# Altium footprint library ICs And Semiconductors SMD.PcbLib: 943 footprints (part 18 of 60)
Each footprint in its own frame and in the unit in brackets; x right, y up, seen from the top. Pads: shape width x height; smd on the part's side, far side on the other; paste and mask are expansions set on the pad; w line width, h text height; cw(c..) or ccw(c..) is an arc to the next point about the centre after c.
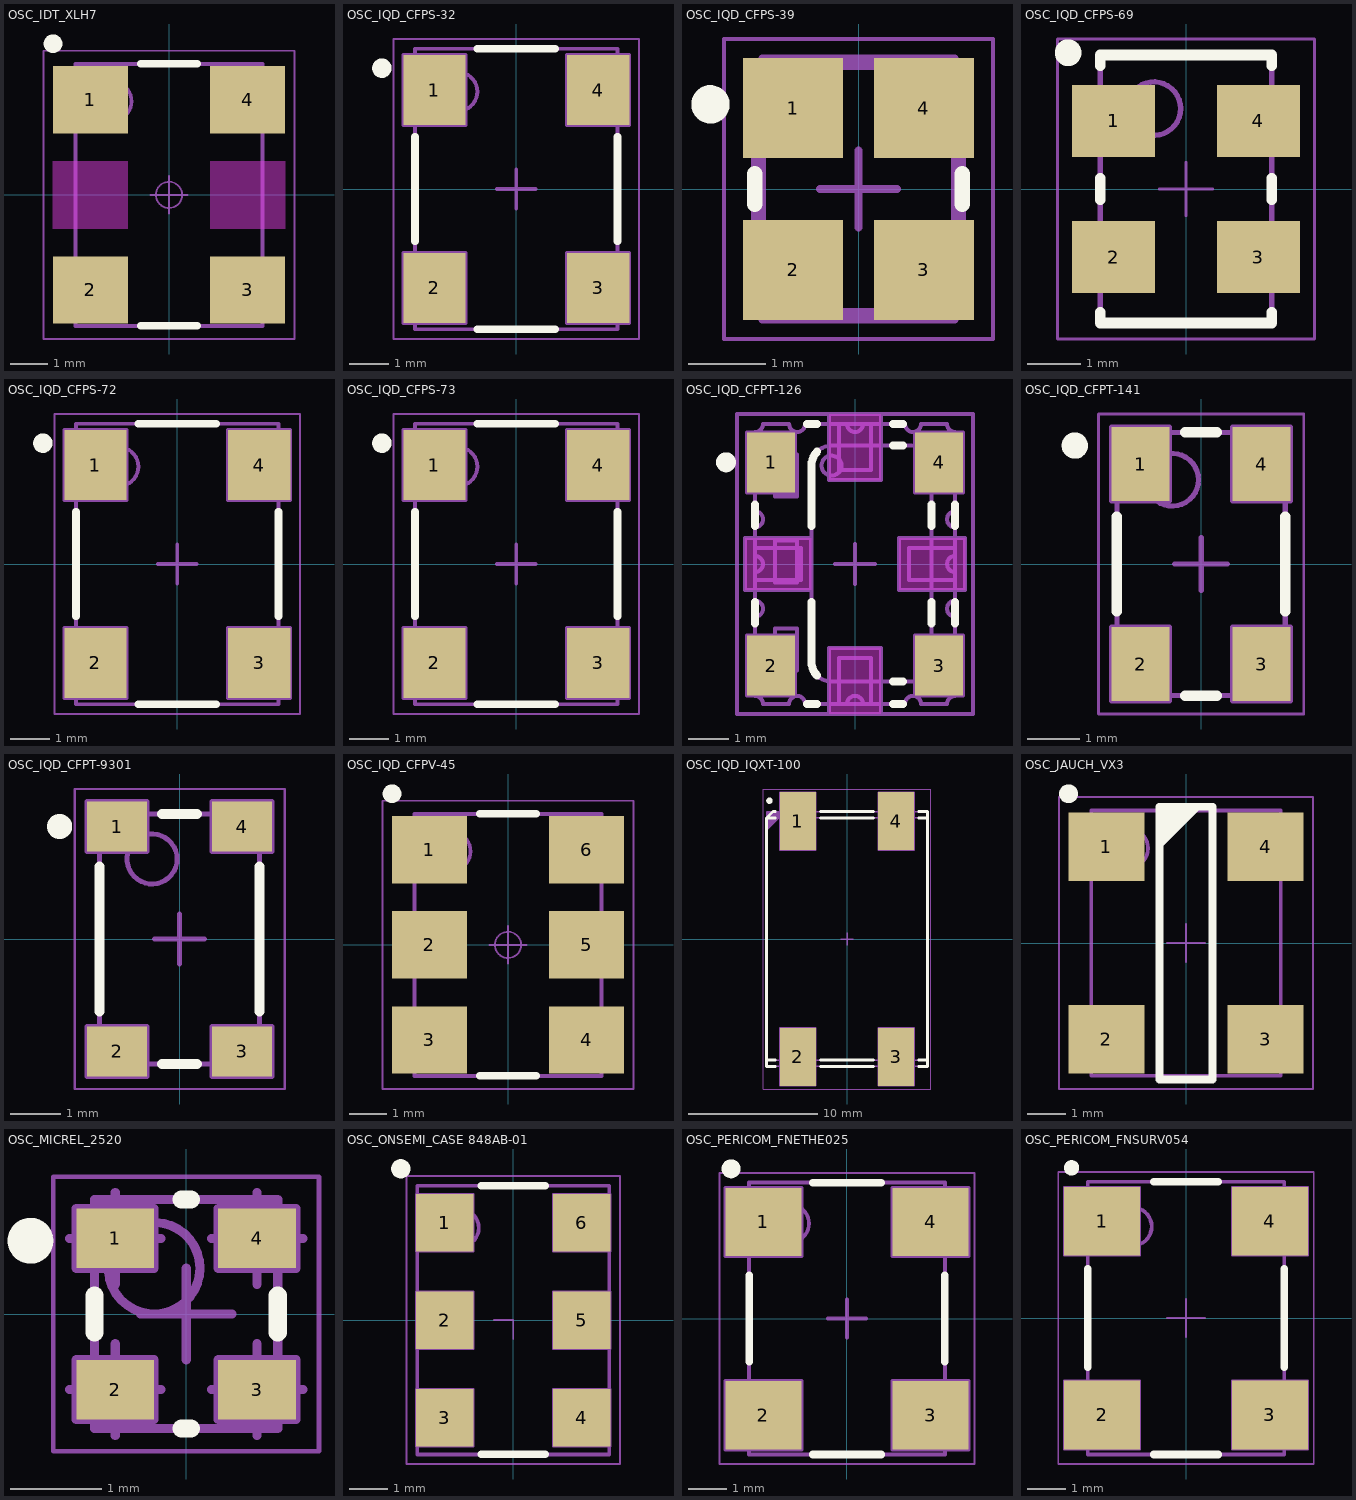
[diagram p17: the footprints below, top view; thin cyan lines are the x and y axes]

## OSC_IDT_XLH7 [mm] "SMD Oscillator, Side Convave, 6 Pins, 5.00x7.00mm IDT XLH Series"
height 1.45
pads (4):
  rect 2x1.8 smd: 1(-2.1,2.54) 2(-2.1,-2.54) 3(2.1,-2.54) 4(2.1,2.54)
Top Layer keep-out:
  region: -3.1,0.9 -1.1,0.9 -1.1,-0.9 -3.1,-0.9
  region: 1.1,0.9 3.1,0.9 3.1,-0.9 1.1,-0.9
Top Overlay:
  circle w0.25: c-3.1,4.04 r0.125
  lines w0.2: -0.75,-3.5 0.75,-3.5 ; -0.75,3.5 0.75,3.5
Mechanical 14:
  circle w0.1: c-1.5,2.5 r0.5
  lines w0.1: -2.5,-3.5 2.5,-3.5 2.5,3.5 -2.5,3.5 -2.5,-3.5
Mechanical 15:
  circle w0.05: c0,0 r0.35
  lines w0.05: -0.5,0 0.5,0 ; 0,-0.5 0,0.5 ; -3.35,-3.85 3.35,-3.85 3.35,3.85 -3.35,3.85 -3.35,-3.85
3D body "OSC_IDT_XLH7.stp": height 1.45, standoff 0, extent -2.6,-3.6 2.6,3.6

## OSC_IQD_CFPS-32 [mm] "Oscillator, Side Concave; 5.08mm Pitch; 4 Pins, 5.00mm L X 7.00mm W X 1.40mm H, CFPS-32 Series"
height 1.4
pads (4):
  rect 1.6x1.8 smd: 1(-2.1,2.54) 2(-2.1,-2.54) 3(2.1,-2.54) 4(2.1,2.54)
Top Overlay:
  circle w0.25: c-3.45,3.1 r0.125
  lines w0.2: -2.6,-1.34 -2.6,1.34 ; -1,-3.6 1,-3.6 ; -1,3.6 1,3.6 ; 2.6,-1.34 2.6,1.34
Mechanical 8:
  lines w0.1: -2.6,-2.54 -2.1,-2.54 ; -2.6,2.54 -2.1,2.54 ; -2.1,-3.04 -2.1,-2.54 ; -2.1,-2.04 -2.1,-2.54 ; -2.1,2.04 -2.1,2.54 ; -2.1,3.04 -2.1,2.54 ; -1.6,-2.54 -2.1,-2.54 ; -1.6,2.54 -2.1,2.54 ; -0.5,0 0,0 ; 0,-0.5 0,0 ; 0,0.5 0,0 ; 0.5,0 0,0 ; 1.6,-2.54 2.1,-2.54 ; 1.6,2.54 2.1,2.54 ; 2.1,-3.04 2.1,-2.54 ; 2.1,-2.04 2.1,-2.54 ; 2.1,2.04 2.1,2.54 ; 2.1,3.04 2.1,2.54 ; 2.6,-2.54 2.1,-2.54 ; 2.6,2.54 2.1,2.54 ; -2.9,-3.44 -1.3,-3.44 -1.3,-1.64 -2.9,-1.64 -2.9,-3.44 ; -2.9,1.64 -1.3,1.64 -1.3,3.44 -2.9,3.44 -2.9,1.64 ; 1.3,-3.44 2.9,-3.44 2.9,-1.64 1.3,-1.64 1.3,-3.44 ; 1.3,1.64 2.9,1.64 2.9,3.44 1.3,3.44 1.3,1.64
Mechanical 14:
  circle w0.1: c-1.5,2.5 r0.5
  lines w0.1: -2.6,-3.6 2.6,-3.6 2.6,3.6 -2.6,3.6 -2.6,-3.6
Mechanical 15:
  lines w0.05: -3.15,-3.85 -3.15,3.85 3.15,3.85 3.15,-3.85 -3.15,-3.85
3D body "OSC_IQD_CFPS-32.stp": height 1.4, standoff 0, extent -2.6,-3.6 2.6,3.6

## OSC_IQD_CFPS-39 [mm] "Oscillator, Side Concave, 2.20mm Pitch, 4 Pins, 2.70mm L X 3.40mm W X 1.20mm H, CFPS-39 Series"
height 1.2
pads (4):
  rect 1.3x1.3 smd: 1(-0.85,1.05) 2(-0.85,-1.05) 3(0.85,-1.05) 4(0.85,1.05)
Top Overlay:
  circle w0.25: c-1.925,1.1 r0.125
  lines w0.2: -1.35,-0.2 -1.35,0.2 ; 1.35,-0.2 1.35,0.2
Mechanical 8:
  lines w0.1: -1.35,-1.05 -0.85,-1.05 ; -1.35,1.05 -0.85,1.05 ; -0.85,-1.55 -0.85,-1.05 ; -0.85,-0.55 -0.85,-1.05 ; -0.85,0.55 -0.85,1.05 ; -0.85,1.55 -0.85,1.05 ; -0.5,0 0,0 ; -0.35,-1.05 -0.85,-1.05 ; -0.35,1.05 -0.85,1.05 ; 0,-0.5 0,0 ; 0,0.5 0,0 ; 0.35,-1.05 0.85,-1.05 ; 0.35,1.05 0.85,1.05 ; 0.5,0 0,0 ; 0.85,-1.55 0.85,-1.05 ; 0.85,-0.55 0.85,-1.05 ; 0.85,0.55 0.85,1.05 ; 0.85,1.55 0.85,1.05 ; 1.35,-1.05 0.85,-1.05 ; 1.35,1.05 0.85,1.05
Mechanical 14:
  circle w0.1: c-0.65,1.05 r0.3
  lines w0.1: -1.35,-1.6 cw(c-1.35,-1.7) -1.25,-1.7 1.25,-1.7 cw(c1.35,-1.7) 1.35,-1.6 1.35,1.6 cw(c1.35,1.7) 1.25,1.7 -1.25,1.7 cw(c-1.35,1.7) -1.35,1.6 -1.35,-1.6 ; -1.25,-1.4 ccw(c-1.05,-1.4) -1.05,-1.6 1.05,-1.6 ccw(c1.05,-1.4) 1.25,-1.4 1.25,1.4 ccw(c1.05,1.4) 1.05,1.6 -1.05,1.6 ccw(c-1.05,1.4) -1.25,1.4 -1.25,-1.4
Mechanical 15:
  lines w0.05: -1.75,-1.95 -1.75,1.95 1.75,1.95 1.75,-1.95 -1.75,-1.95
3D body "OSC_IQD_CFPS-39.stp": height 1.3, standoff 0, extent -1.35,-1.7 1.35,1.7

## OSC_IQD_CFPS-69 [mm] "Oscillator, Side Concave, 2.54mm Pitch, 4 Pins, 3.20mm L X 5.00mm W X 1.00mm H, CFPS-69 Series"
height 0.95
pads (4):
  rect 1.55x1.35 smd: 1(-1.35,1.27) 2(-1.35,-1.27) 3(1.35,-1.27) 4(1.35,1.27)
Top Overlay:
  circle w0.25: c-2.2,2.545 r0.125
  lines w0.2: -1.6,-2.3 -1.6,-2.5 1.6,-2.5 1.6,-2.3 ; -1.6,-0.2 -1.6,0.2 ; -1.6,2.3 -1.6,2.5 1.6,2.5 1.6,2.3 ; 1.6,-0.2 1.6,0.2
Mechanical 14:
  circle w0.1: c-0.6,1.5 r0.5
  lines w0.1: -1.6,-2.5 1.6,-2.5 1.6,2.5 -1.6,2.5 -1.6,-2.5
Mechanical 15:
  lines w0.05: -0.5,0 0.5,0 ; 0,-0.5 0,0.5 ; -2.4,-2.8 2.4,-2.8 2.4,2.8 -2.4,2.8 -2.4,-2.8
3D body "OSC_IQD_CFPS-69.stp": height 0.95, standoff 0, extent -1.7,-2.6 1.7,2.6

## OSC_IQD_CFPS-72 [mm] "Oscillator, Side Concave, 5.08mm Pitch, 4 Pins, 5.00mm L X 7.00mm W X 1.40mm H, CFPS-72 Series"
height 1.4
pads (4):
  rect 1.6x1.8 smd: 1(-2.1,2.54) 2(-2.1,-2.54) 3(2.1,-2.54) 4(2.1,2.54)
Top Overlay:
  circle w0.25: c-3.45,3.1 r0.125
  lines w0.2: -2.6,-1.34 -2.6,1.34 ; -1,-3.6 1,-3.6 ; -1,3.6 1,3.6 ; 2.6,-1.34 2.6,1.34
Mechanical 8:
  lines w0.1: -2.6,-2.54 -2.1,-2.54 ; -2.6,2.54 -2.1,2.54 ; -2.1,-3.04 -2.1,-2.54 ; -2.1,-2.04 -2.1,-2.54 ; -2.1,2.04 -2.1,2.54 ; -2.1,3.04 -2.1,2.54 ; -1.6,-2.54 -2.1,-2.54 ; -1.6,2.54 -2.1,2.54 ; -0.5,0 0,0 ; 0,-0.5 0,0 ; 0,0.5 0,0 ; 0.5,0 0,0 ; 1.6,-2.54 2.1,-2.54 ; 1.6,2.54 2.1,2.54 ; 2.1,-3.04 2.1,-2.54 ; 2.1,-2.04 2.1,-2.54 ; 2.1,2.04 2.1,2.54 ; 2.1,3.04 2.1,2.54 ; 2.6,-2.54 2.1,-2.54 ; 2.6,2.54 2.1,2.54 ; -2.9,-3.44 -1.3,-3.44 -1.3,-1.64 -2.9,-1.64 -2.9,-3.44 ; -2.9,1.64 -1.3,1.64 -1.3,3.44 -2.9,3.44 -2.9,1.64 ; 1.3,-3.44 2.9,-3.44 2.9,-1.64 1.3,-1.64 1.3,-3.44 ; 1.3,1.64 2.9,1.64 2.9,3.44 1.3,3.44 1.3,1.64
Mechanical 14:
  circle w0.1: c-1.5,2.5 r0.5
  lines w0.1: -2.6,-3.6 2.6,-3.6 2.6,3.6 -2.6,3.6 -2.6,-3.6
Mechanical 15:
  lines w0.05: -3.15,-3.85 -3.15,3.85 3.15,3.85 3.15,-3.85 -3.15,-3.85
3D body "OSC_IQD_CFPS-72.stp": height 1.4, standoff 0, extent -2.6,-3.6 2.6,3.6

## OSC_IQD_CFPS-73 [mm] "Oscillator, Side Concave, 5.08mm Pitch, 4 Pins, 5.00mm L X 7.00mm W X 1.40mm H, CFPS-73 Series"
height 1.4
pads (4):
  rect 1.6x1.8 smd: 1(-2.1,2.54) 2(-2.1,-2.54) 3(2.1,-2.54) 4(2.1,2.54)
Top Overlay:
  circle w0.25: c-3.45,3.1 r0.125
  lines w0.2: -2.6,-1.34 -2.6,1.34 ; -1,-3.6 1,-3.6 ; -1,3.6 1,3.6 ; 2.6,-1.34 2.6,1.34
Mechanical 8:
  lines w0.1: -2.6,-2.54 -2.1,-2.54 ; -2.6,2.54 -2.1,2.54 ; -2.1,-3.04 -2.1,-2.54 ; -2.1,-2.04 -2.1,-2.54 ; -2.1,2.04 -2.1,2.54 ; -2.1,3.04 -2.1,2.54 ; -1.6,-2.54 -2.1,-2.54 ; -1.6,2.54 -2.1,2.54 ; -0.5,0 0,0 ; 0,-0.5 0,0 ; 0,0.5 0,0 ; 0.5,0 0,0 ; 1.6,-2.54 2.1,-2.54 ; 1.6,2.54 2.1,2.54 ; 2.1,-3.04 2.1,-2.54 ; 2.1,-2.04 2.1,-2.54 ; 2.1,2.04 2.1,2.54 ; 2.1,3.04 2.1,2.54 ; 2.6,-2.54 2.1,-2.54 ; 2.6,2.54 2.1,2.54 ; -2.9,-3.44 -2.9,-1.64 -1.3,-1.64 -1.3,-3.44 -2.9,-3.44 ; -2.9,1.64 -2.9,3.44 -1.3,3.44 -1.3,1.64 -2.9,1.64 ; 1.3,-3.44 1.3,-1.64 2.9,-1.64 2.9,-3.44 1.3,-3.44 ; 1.3,1.64 1.3,3.44 2.9,3.44 2.9,1.64 1.3,1.64
Mechanical 14:
  circle w0.1: c-1.5,2.5 r0.5
  lines w0.1: -2.6,-3.6 -2.6,3.6 2.6,3.6 2.6,-3.6 -2.6,-3.6
Mechanical 15:
  lines w0.05: -3.15,-3.85 3.15,-3.85 3.15,3.85 -3.15,3.85 -3.15,-3.85
3D body "OSC_IQD_CFPS-73.stp": height 1.4, standoff 0, extent -2.6,-3.6 2.6,3.6

## OSC_IQD_CFPT-126 [mm] "Oscillator, Side Concave, 5.08mm Pitch, 4 Pins, 5.00mm L X 7.00mm W X 2.00mm H, CFPT-126 Series"
height 2
pads (4):
  rect 1.2x1.5 smd: 1(-2.1,2.54) 2(-2.1,-2.54) 3(2.1,-2.54) 4(2.1,2.54)
Top Layer keep-out:
  region: 1.1,-0.645 2.75,-0.645 2.75,0.645 1.1,0.645
  region: -2.75,-0.645 -1.1,-0.645 -1.1,0.645 -2.75,0.645
  region: -0.645,-2.1 -0.645,-3.75 0.645,-3.75 0.645,-2.1
  region: -0.645,3.75 -0.645,2.1 0.645,2.1 0.645,3.75
Top Overlay:
  circle w0.25: c-3.227,2.543 r0.125
  lines w0.2: -2.5,-1.49 -2.5,-0.945 ; -2.5,0.945 -2.5,1.49 ; -1.2,-3.5 -0.945,-3.5 ; -1.2,3.5 -0.945,3.5 ; -1.089,-0.945 -1.089,-2.441 ccw(c-0.589,-2.441) -0.945,-2.792 ; -1.089,0.945 -1.089,2.459 cw(c-0.589,2.459) -0.945,2.81 ; 0.945,-3.5 1.2,-3.5 ; 0.945,-2.941 1.2,-2.941 ; 0.945,2.959 1.2,2.959 ; 0.945,3.5 1.2,3.5 ; 1.914,-1.49 1.914,-0.945 ; 1.914,0.945 1.914,1.49 ; 2.5,-1.49 2.5,-0.945 ; 2.5,0.945 2.5,1.49
Mechanical 8:
  lines w0.1: -2.6,-2.54 -2.1,-2.54 ; -2.6,2.54 -2.1,2.54 ; -2.1,-3.04 -2.1,-2.54 ; -2.1,-2.04 -2.1,-2.54 ; -2.1,2.04 -2.1,2.54 ; -2.1,3.04 -2.1,2.54 ; -1.6,-2.54 -2.1,-2.54 ; -1.6,2.54 -2.1,2.54 ; -0.5,0 0,0 ; 0,-0.5 0,0 ; 0,0.5 0,0 ; 0.5,0 0,0 ; 1.6,-2.54 2.1,-2.54 ; 1.6,2.54 2.1,2.54 ; 2.1,-3.04 2.1,-2.54 ; 2.1,-2.04 2.1,-2.54 ; 2.1,2.04 2.1,2.54 ; 2.1,3.04 2.1,2.54 ; 2.6,-2.54 2.1,-2.54 ; 2.6,2.54 2.1,2.54 ; -2.75,-0.645 -1.1,-0.645 -1.1,0.645 -2.75,0.645 -2.75,-0.645 ; -2.7,-3.29 -2.7,-1.79 -1.5,-1.79 -1.5,-3.29 -2.7,-3.29 ; -2.7,1.79 -2.7,3.29 -1.5,3.29 -1.5,1.79 -2.7,1.79 ; -2.5,-0.395 -1.35,-0.395 -1.35,0.395 -2.5,0.395 -2.5,-0.395 ; -0.645,-3.75 0.645,-3.75 0.645,-2.1 -0.645,-2.1 -0.645,-3.75 ; -0.645,2.1 0.645,2.1 0.645,3.75 -0.645,3.75 -0.645,2.1 ; -0.395,-3.5 0.395,-3.5 0.395,-2.35 -0.395,-2.35 -0.395,-3.5 ; -0.395,2.35 0.395,2.35 0.395,3.5 -0.395,3.5 -0.395,2.35 ; 1.1,-0.645 2.75,-0.645 2.75,0.645 1.1,0.645 1.1,-0.645 ; 1.35,-0.395 2.5,-0.395 2.5,0.395 1.35,0.395 1.35,-0.395 ; 1.5,-3.29 1.5,-1.79 2.7,-1.79 2.7,-3.29 1.5,-3.29 ; 1.5,1.79 1.5,3.29 2.7,3.29 2.7,1.79 1.5,1.79
Mechanical 14:
  circle w0.1: c-0.589,2.459 r0.25
  lines w0.1: -2.5,-3.3 cw(c-2.5,-3.5) -2.3,-3.5 -1.647,-3.5 cw(c-1.448,-3.5) -1.248,-3.5 -0.2,-3.5 cw(c0,-3.5) 0.2,-3.5 1.248,-3.5 cw(c1.448,-3.5) 1.647,-3.5 2.3,-3.5 cw(c2.5,-3.5) 2.5,-3.3 2.5,-2.74 cw(c2.5,-2.54) 2.5,-2.34 2.5,-1.318 cw(c2.5,-1.118) 2.5,-0.918 2.5,-0.2 cw(c2.5,0) 2.5,0.2 2.5,0.918 cw(c2.5,1.118) 2.5,1.318 2.5,2.34 cw(c2.5,2.54) 2.5,2.74 2.5,3.3 cw(c2.5,3.5) 2.3,3.5 1.647,3.5 cw(c1.448,3.5) 1.248,3.5 0.2,3.5 cw(c0,3.5) -0.2,3.5 -1.248,3.5 cw(c-1.448,3.5) -1.647,3.5 -2.3,3.5 cw(c-2.5,3.5) -2.5,3.3 -2.5,2.74 cw(c-2.5,2.54) -2.5,2.34 -2.5,1.318 cw(c-2.5,1.118) -2.5,0.918 -2.5,0.2 cw(c-2.5,0) -2.5,-0.2 -2.5,-0.918 cw(c-2.5,-1.118) -2.5,-1.318 -2.5,-2.34 cw(c-2.5,-2.54) -2.5,-2.74 -2.5,-3.3 ; -1.998,-2.666 -1.998,-1.616 -1.448,-1.616 -1.448,-2.666 -1.998,-2.666 ; -1.998,-0.459 -1.448,-0.459 -1.448,0.591 -1.998,0.591 -1.998,-0.459 ; -1.998,1.684 -1.448,1.684 -1.448,2.734 -1.998,2.734 -1.998,1.684 ; -1.089,-2.441 ccw(c-0.589,-2.441) -0.589,-2.941 1.414,-2.941 ccw(c1.414,-2.441) 1.914,-2.441 1.914,2.459 ccw(c1.414,2.459) 1.414,2.959 -0.589,2.959 ccw(c-0.589,2.459) -1.089,2.459 -1.089,-2.441
Mechanical 15:
  lines w0.1: -2.95,-3.75 -2.95,3.75 2.95,3.75 2.95,-3.75 -2.95,-3.75
3D body "OSC_IQD_CFPT-126.stp": height 2, standoff 0, extent -2.5,-3.5 2.5,3.5

## OSC_IQD_CFPT-141 [mm] "Oscillator, Corner Concave, 3.80mm Pitch, 4 Pins, 3.20mm L X 5.00mm W X 1.10mm H, CFPT-141 Series"
height 1.1
pads (4):
  rect 1.1x1.4 smd: 1(-1.15,1.9) 2(-1.15,-1.9) 3(1.15,-1.9) 4(1.15,1.9)
Top Overlay:
  circle w0.25: c-2.4,2.25 r0.125
  lines w0.2: -1.6,-0.9 -1.6,0.9 ; -0.3,-2.5 0.3,-2.5 ; -0.3,2.5 0.3,2.5 ; 1.6,-0.9 1.6,0.9
Mechanical 8:
  lines w0.1: -1.65,-1.9 -1.15,-1.9 ; -1.65,1.9 -1.15,1.9 ; -1.15,-2.4 -1.15,-1.9 ; -1.15,-1.4 -1.15,-1.9 ; -1.15,1.4 -1.15,1.9 ; -1.15,2.4 -1.15,1.9 ; -0.65,-1.9 -1.15,-1.9 ; -0.65,1.9 -1.15,1.9 ; -0.5,0 0,0 ; 0,-0.5 0,0 ; 0,0.5 0,0 ; 0.5,0 0,0 ; 0.65,-1.9 1.15,-1.9 ; 0.65,1.9 1.15,1.9 ; 1.15,-2.4 1.15,-1.9 ; 1.15,-1.4 1.15,-1.9 ; 1.15,1.4 1.15,1.9 ; 1.15,2.4 1.15,1.9 ; 1.65,-1.9 1.15,-1.9 ; 1.65,1.9 1.15,1.9 ; -1.7,-2.6 -1.7,-1.2 -0.6,-1.2 -0.6,-2.6 -1.7,-2.6 ; -1.7,1.2 -1.7,2.6 -0.6,2.6 -0.6,1.2 -1.7,1.2 ; 0.6,-2.6 0.6,-1.2 1.7,-1.2 1.7,-2.6 0.6,-2.6 ; 0.6,1.2 0.6,2.6 1.7,2.6 1.7,1.2 0.6,1.2
Mechanical 14:
  circle w0.1: c-0.55,1.6 r0.5
  lines w0.1: -1.6,-2.35 cw(c-1.6,-2.5) -1.45,-2.5 1.45,-2.5 cw(c1.6,-2.5) 1.6,-2.35 1.6,2.35 cw(c1.6,2.5) 1.45,2.5 -1.45,2.5 cw(c-1.6,2.5) -1.6,2.35 -1.6,-2.35
Mechanical 15:
  lines w0.05: -1.95,-2.85 -1.95,2.85 1.95,2.85 1.95,-2.85 -1.95,-2.85
3D body "OSC_IQD_CFPT-141.stp": height 1.1, standoff 0, extent -1.6,-2.5 1.6,2.5

## OSC_IQD_CFPT-9301 [mm] "Oscillator, Side Concave, 4.50mm Pitch, 4 Pins, 3.20mm L X 5.00mm W X 1.80mm H, CFPT-9301 Series"
height 1.8
pads (4):
  rect 1.2x1 smd: 1(-1.25,2.25) 2(-1.25,-2.25) 3(1.25,-2.25) 4(1.25,2.25)
Top Overlay:
  circle w0.25: c-2.4,2.25 r0.125
  lines w0.2: -1.6,-1.45 -1.6,1.45 ; -0.35,-2.5 0.35,-2.5 ; -0.35,2.5 0.35,2.5 ; 1.6,-1.45 1.6,1.45
Mechanical 8:
  lines w0.1: -1.75,-2.25 -1.25,-2.25 ; -1.75,2.25 -1.25,2.25 ; -1.25,-2.75 -1.25,-2.25 ; -1.25,-1.75 -1.25,-2.25 ; -1.25,1.75 -1.25,2.25 ; -1.25,2.75 -1.25,2.25 ; -0.75,-2.25 -1.25,-2.25 ; -0.75,2.25 -1.25,2.25 ; -0.5,0 0,0 ; 0,-0.5 0,0 ; 0,0.5 0,0 ; 0.5,0 0,0 ; 0.75,-2.25 1.25,-2.25 ; 0.75,2.25 1.25,2.25 ; 1.25,-2.75 1.25,-2.25 ; 1.25,-1.75 1.25,-2.25 ; 1.25,1.75 1.25,2.25 ; 1.25,2.75 1.25,2.25 ; 1.75,-2.25 1.25,-2.25 ; 1.75,2.25 1.25,2.25 ; -1.85,-2.75 -1.85,-1.75 -0.65,-1.75 -0.65,-2.75 -1.85,-2.75 ; -1.85,1.75 -1.85,2.75 -0.65,2.75 -0.65,1.75 -1.85,1.75 ; 0.65,-2.75 0.65,-1.75 1.85,-1.75 1.85,-2.75 0.65,-2.75 ; 0.65,1.75 0.65,2.75 1.85,2.75 1.85,1.75 0.65,1.75
Mechanical 14:
  circle w0.1: c-0.55,1.6 r0.5
  lines w0.1: -1.6,-2.35 cw(c-1.6,-2.5) -1.45,-2.5 1.45,-2.5 cw(c1.6,-2.5) 1.6,-2.35 1.6,2.35 cw(c1.6,2.5) 1.45,2.5 -1.45,2.5 cw(c-1.6,2.5) -1.6,2.35 -1.6,-2.35
Mechanical 15:
  lines w0.05: -2.1,-3 -2.1,3 2.1,3 2.1,-3 -2.1,-3
3D body "OSC_IQD_CFPT-9301.stp": height 1.8, standoff 0, extent -1.6,-2.5 1.6,2.5

## OSC_IQD_CFPV-45 [mm] "Oscillator, Side Concave, 2.54mm Pitch, 6 Pins, 5.00mm L X 7.00mm W X 1.70mm H, CFPV-45 Series"
height 1.7
pads (6):
  rect 2x1.8 smd: 1(-2.1,2.54) 2(-2.1,0) 3(-2.1,-2.54) 4(2.1,-2.54) 5(2.1,0) 6(2.1,2.54)
Top Overlay:
  circle w0.25: c-3.1,4.04 r0.125
  lines w0.2: -0.75,-3.5 0.75,-3.5 ; -0.75,3.5 0.75,3.5
Mechanical 14:
  circle w0.1: c-1.5,2.5 r0.5
  lines w0.1: -2.5,-3.5 -2.5,3.5 2.5,3.5 2.5,-3.5 -2.5,-3.5
Mechanical 15:
  circle w0.05: c0,0 r0.35
  lines w0.05: -0.5,0 0.5,0 ; 0,-0.5 0,0.5 ; -3.35,-3.85 -3.35,3.85 3.35,3.85 3.35,-3.85 -3.35,-3.85
3D body "OSC_IQD_CFPV-45.stp": height 1.7, standoff 0, extent -2.6,-3.6 2.6,3.6

## OSC_IQD_IQXT-100 [mm] "Oscillator, 7.62mm Pitch, 4 Pins, 12.5mm L X 19.8mm W X 5.2mm H, IQXT-100 Series"
height 5.7
pads (4):
  rect 2.8x4.5 smd: 1(-3.81,9.15) 2(-3.81,-9.15) 3(3.81,-9.15) 4(3.81,9.15)
Top Overlay:
  circle w0.25: c-6.025,10.74 r0.125
  lines w0.2: -6.25,-9.4 -5.56,-9.4 ; -5.56,-9.9 -6.25,-9.9 -6.25,9.4 ; -5.56,9.4 -6.25,9.4 ; -5.56,9.9 -5.75,9.9 -6.25,9.4 ; -2.06,-9.9 2.06,-9.9 ; -2.06,-9.4 2.06,-9.4 ; -2.06,9.4 2.06,9.4 ; -2.06,9.9 2.06,9.9 ; 5.56,-9.9 6.25,-9.9 6.25,9.9 5.56,9.9 ; 5.56,-9.4 6.25,-9.4 ; 5.56,9.4 6.25,9.4
Mechanical 8:
  lines w0.1: -4.31,-9.15 -3.81,-9.15 ; -4.31,9.15 -3.81,9.15 ; -3.81,-9.65 -3.81,-9.15 ; -3.81,-8.65 -3.81,-9.15 ; -3.81,8.65 -3.81,9.15 ; -3.81,9.65 -3.81,9.15 ; -3.31,-9.15 -3.81,-9.15 ; -3.31,9.15 -3.81,9.15 ; -0.5,0 0,0 ; 0,-0.5 0,0 ; 0,0.5 0,0 ; 0.5,0 0,0 ; 3.31,-9.15 3.81,-9.15 ; 3.31,9.15 3.81,9.15 ; 3.81,-9.65 3.81,-9.15 ; 3.81,-8.65 3.81,-9.15 ; 3.81,8.65 3.81,9.15 ; 3.81,9.65 3.81,9.15 ; 4.31,-9.15 3.81,-9.15 ; 4.31,9.15 3.81,9.15 ; -5.21,-11.4 -2.41,-11.4 -2.41,-6.9 -5.21,-6.9 -5.21,-11.4 ; -5.21,6.9 -2.41,6.9 -2.41,11.4 -5.21,11.4 -5.21,6.9 ; 2.41,-11.4 5.21,-11.4 5.21,-6.9 2.41,-6.9 2.41,-11.4 ; 2.41,6.9 5.21,6.9 5.21,11.4 2.41,11.4 2.41,6.9
Mechanical 14:
  lines w0.1: -6.25,-9.4 6.25,-9.4 ; -6.25,8.486 -4.836,9.9 ; -6.25,8.627 -4.977,9.9 ; -6.25,8.769 -5.119,9.9 ; -6.25,8.91 -5.26,9.9 ; -6.25,9.051 -5.401,9.9 ; -6.25,9.193 -5.543,9.9 ; -6.25,9.334 -5.684,9.9 ; -6.25,9.4 6.25,9.4 ; -6.25,9.476 -5.826,9.9 ; -6.25,9.617 -5.967,9.9 ; -6.25,9.759 -6.109,9.9 ; -6.25,-9.9 6.25,-9.9 6.25,9.9 -6.25,9.9 -6.25,-9.9
Mechanical 15:
  lines w0.05: -6.5,-11.65 -6.5,11.65 6.5,11.65 6.5,-11.65 -6.5,-11.65
3D body "OSC_IQD_IQXT-100.stp": height 5.7, standoff 0, extent -6.25,-9.9 6.25,9.9

## OSC_JAUCH_VX3 [mm] "SMD Oscillator, Side Convave, 4 pins, 5.00x7.00mm, VX3 Serie"
height 1.75
pads (4):
  rect 2x1.8 smd: 1(-2.1,2.54) 2(-2.1,-2.54) 3(2.1,-2.54) 4(2.1,2.54)
Top Overlay:
  circle w0.25: c-3.1,3.94 r0.125
  lines w0.2: -0.7,2.6 0.3,3.6 ; -0.7,2.8 0.1,3.6 ; -0.7,3 -0.1,3.6 ; -0.7,3.2 -0.3,3.6 ; -0.7,3.4 -0.5,3.6 ; -0.7,-3.6 -0.7,3.6 0.7,3.6 0.7,-3.6 -0.7,-3.6
Mechanical 14:
  circle w0.1: c-1.5,2.5 r0.5
  lines w0.1: -2.5,-3.5 2.5,-3.5 2.5,3.5 -2.5,3.5 -2.5,-3.5
Mechanical 15:
  lines w0.05: -0.5,0 0.5,0 ; 0,-0.5 0,0.5 ; -3.35,-3.85 3.35,-3.85 3.35,3.85 -3.35,3.85 -3.35,-3.85
3D body "OSC_JAUCH_VX3.stp": height 1.75, standoff 0, extent -2.6,-3.6 2.6,3.6

## OSC_MICREL_2520 [mm] "MICREL SMD Oscillator, QFN, 4 pins, 2.5mm x 2.0mm"
height 0.9
pads (4):
  rect 0.85x0.65 smd: 1(-0.775,0.825) 2(-0.775,-0.825) 3(0.775,-0.825) 4(0.775,0.825)
Top Overlay:
  circle w0.25: c-1.7,0.8 r0.125
  lines w0.2: -1,-0.2 -1,0.2 ; -0.05,-1.25 0.05,-1.25 ; -0.05,1.25 0.05,1.25 ; 1,-0.2 1,0.2
Mechanical 8:
  lines w0.1: -1.275,-0.825 -0.775,-0.825 ; -1.275,0.825 -0.775,0.825 ; -0.775,-1.325 -0.775,-0.825 ; -0.775,-0.325 -0.775,-0.825 ; -0.775,0.325 -0.775,0.825 ; -0.775,1.325 -0.775,0.825 ; -0.5,0 0,0 ; -0.275,-0.825 -0.775,-0.825 ; -0.275,0.825 -0.775,0.825 ; 0,-0.5 0,0 ; 0,0.5 0,0 ; 0.275,-0.825 0.775,-0.825 ; 0.275,0.825 0.775,0.825 ; 0.5,0 0,0 ; 0.775,-1.325 0.775,-0.825 ; 0.775,-0.325 0.775,-0.825 ; 0.775,0.325 0.775,0.825 ; 0.775,1.325 0.775,0.825 ; 1.275,-0.825 0.775,-0.825 ; 1.275,0.825 0.775,0.825 ; -1.2,-1.15 -1.2,-0.5 -0.35,-0.5 -0.35,-1.15 -1.2,-1.15 ; -1.2,0.5 -1.2,1.15 -0.35,1.15 -0.35,0.5 -1.2,0.5 ; 0.35,-1.15 0.35,-0.5 1.2,-0.5 1.2,-1.15 0.35,-1.15 ; 0.35,0.5 0.35,1.15 1.2,1.15 1.2,0.5 0.35,0.5
Mechanical 14:
  circle w0.1: c-0.35,0.5 r0.5
  lines w0.1: -1,-1.25 -1,1.25 1,1.25 1,-1.25 -1,-1.25
Mechanical 15:
  lines w0.05: -1.45,-1.5 -1.45,1.5 1.45,1.5 1.45,-1.5 -1.45,-1.5
3D body "OSC_MICREL_2520.stp": height 0.9, standoff 0, extent -1,-1.25 1,1.25

## OSC_ONSEMI_CASE 848AB-01 [mm] "SMD Oscillator, Side Convave, 6 pins, 5x7mm, Case 848AB-01"
height 1.9
pads (6):
  rect 1.5x1.5 smd: 1(-1.78,2.54) 2(-1.78,0) 3(-1.78,-2.54) 4(1.78,-2.54) 5(1.78,0) 6(1.78,2.54)
Top Overlay:
  circle w0.25: c-2.93,3.94 r0.125
  lines w0.2: -0.83,-3.5 0.83,-3.5 ; -0.83,3.5 0.83,3.5
Mechanical 8:
  lines w0.05: -2.28,-2.54 -1.78,-2.54 -1.78,-3.04 ; -2.28,0 -1.78,0 -1.78,-0.5 ; -2.28,2.54 -1.78,2.54 -1.78,2.04 ; -0.5,0 0,0 0,-0.5 ; 1.28,-2.54 1.78,-2.54 1.78,-3.04 ; 1.28,0 1.78,0 1.78,-0.5 ; 1.28,2.54 1.78,2.54 1.78,2.04 ; -2.53,-3.29 -2.53,-1.79 -1.03,-1.79 -1.03,-3.29 -2.53,-3.29 ; -2.53,-0.75 -2.53,0.75 -1.03,0.75 -1.03,-0.75 -2.53,-0.75 ; -2.53,1.79 -2.53,3.29 -1.03,3.29 -1.03,1.79 -2.53,1.79 ; 1.03,-3.29 1.03,-1.79 2.53,-1.79 2.53,-3.29 1.03,-3.29 ; 1.03,-0.75 1.03,0.75 2.53,0.75 2.53,-0.75 1.03,-0.75 ; 1.03,1.79 1.03,3.29 2.53,3.29 2.53,1.79 1.03,1.79
Mechanical 14:
  circle w0.1: c-1.4,2.4 r0.5
  lines w0.1: -2.5,-3.5 -2.5,3.5 2.5,3.5 2.5,-3.5 -2.5,-3.5
Mechanical 15:
  lines w0.05: -2.78,-3.75 2.78,-3.75 2.78,3.75 -2.78,3.75 -2.78,-3.75
3D body "OSC_ONSEMI_CASE 848AB-01.stp": height 1.9, standoff 0, extent -2.5,-3.5 2.5,3.5

## OSC_PERICOM_FNETHE025 [mm] "SMD Oscillator, side convave, 4 pins, 5.00x7.00mm"
height 1.55
pads (4):
  rect 2x1.8 smd: 1(-2.2,2.54) 2(-2.2,-2.54) 3(2.2,-2.54) 4(2.2,2.54)
Top Overlay:
  circle w0.25: c-3.05,3.94 r0.125
  lines w0.2: -2.575,-1.14 -2.575,1.14 ; -0.9,-3.575 0.9,-3.575 ; -0.9,3.575 0.9,3.575 ; 2.575,-1.14 2.575,1.14
Mechanical 8:
  lines w0.1: -2.7,-2.54 -2.2,-2.54 ; -2.7,2.54 -2.2,2.54 ; -2.2,-3.04 -2.2,-2.54 ; -2.2,-2.04 -2.2,-2.54 ; -2.2,2.04 -2.2,2.54 ; -2.2,3.04 -2.2,2.54 ; -1.7,-2.54 -2.2,-2.54 ; -1.7,2.54 -2.2,2.54 ; -0.5,0 0,0 ; 0,-0.5 0,0 ; 0,0.5 0,0 ; 0.5,0 0,0 ; 1.7,-2.54 2.2,-2.54 ; 1.7,2.54 2.2,2.54 ; 2.2,-3.04 2.2,-2.54 ; 2.2,-2.04 2.2,-2.54 ; 2.2,2.04 2.2,2.54 ; 2.2,3.04 2.2,2.54 ; 2.7,-2.54 2.2,-2.54 ; 2.7,2.54 2.2,2.54 ; -3.2,-3.44 -1.2,-3.44 -1.2,-1.64 -3.2,-1.64 -3.2,-3.44 ; -3.2,1.64 -1.2,1.64 -1.2,3.44 -3.2,3.44 -3.2,1.64 ; 1.2,-3.44 3.2,-3.44 3.2,-1.64 1.2,-1.64 1.2,-3.44 ; 1.2,1.64 3.2,1.64 3.2,3.44 1.2,3.44 1.2,1.64
Mechanical 14:
  circle w0.1: c-1.5,2.5 r0.5
  lines w0.1: -2.575,-3.575 -2.575,3.575 2.575,3.575 2.575,-3.575 -2.575,-3.575
Mechanical 15:
  lines w0.05: -3.35,-3.825 -3.35,3.825 3.35,3.825 3.35,-3.825 -3.35,-3.825
3D body "OSC_PERICOM_FNETHE025.stp": height 1.55, standoff 0, extent -2.6,-3.6 2.6,3.6

## OSC_PERICOM_FNSURV054 [mm] "SMD Oscillator, side convave, 4 pins, 5.00x7.00mm"
height 1.55
pads (4):
  rect 2x1.8 smd: 1(-2.2,2.54) 2(-2.2,-2.54) 3(2.2,-2.54) 4(2.2,2.54)
Top Overlay:
  circle w0.2: c-3,3.94 r0.1
  lines w0.2: -2.575,-1.29 -2.575,1.29 ; -0.85,-3.575 0.85,-3.575 ; -0.85,3.575 0.85,3.575 ; 2.575,-1.29 2.575,1.29
Mechanical 8:
  lines w0.05: -2.7,-2.54 -2.2,-2.54 ; -2.7,2.54 -2.2,2.54 ; -2.2,-3.04 -2.2,-2.54 ; -2.2,-2.04 -2.2,-2.54 ; -2.2,2.04 -2.2,2.54 ; -2.2,3.04 -2.2,2.54 ; -1.7,-2.54 -2.2,-2.54 ; -1.7,2.54 -2.2,2.54 ; -0.5,0 0,0 ; 0,-0.5 0,0 ; 0,0.5 0,0 ; 0.5,0 0,0 ; 1.7,-2.54 2.2,-2.54 ; 1.7,2.54 2.2,2.54 ; 2.2,-3.04 2.2,-2.54 ; 2.2,-2.04 2.2,-2.54 ; 2.2,2.04 2.2,2.54 ; 2.2,3.04 2.2,2.54 ; 2.7,-2.54 2.2,-2.54 ; 2.7,2.54 2.2,2.54 ; -3.2,-3.44 -3.2,-1.64 -1.2,-1.64 -1.2,-3.44 -3.2,-3.44 ; -3.2,1.64 -3.2,3.44 -1.2,3.44 -1.2,1.64 -3.2,1.64 ; 1.2,-3.44 1.2,-1.64 3.2,-1.64 3.2,-3.44 1.2,-3.44 ; 1.2,1.64 1.2,3.44 3.2,3.44 3.2,1.64 1.2,1.64
Mechanical 14:
  circle w0.1: c-1.4,2.4 r0.5
  lines w0.1: -2.575,-3.575 2.575,-3.575 2.575,3.575 -2.575,3.575 -2.575,-3.575
Mechanical 15:
  lines w0.05: -3.35,-3.825 3.35,-3.825 3.35,3.825 -3.35,3.825 -3.35,-3.825
3D body "OSC_PERICOM_FNSURV054.stp": height 1.55, standoff 0, extent -2.6,-3.6 2.6,3.6